# Altium footprint library KEY_PLC1.PcbLib: 123 footprints (part 1 of 8)
Each footprint in its own frame and in the unit in brackets; x right, y up, seen from the top. Pads: shape width x height; smd on the part's side, far side on the other; paste and mask are expansions set on the pad; w line width, h text height; cw(c..) or ccw(c..) is an arc to the next point about the centre after c.
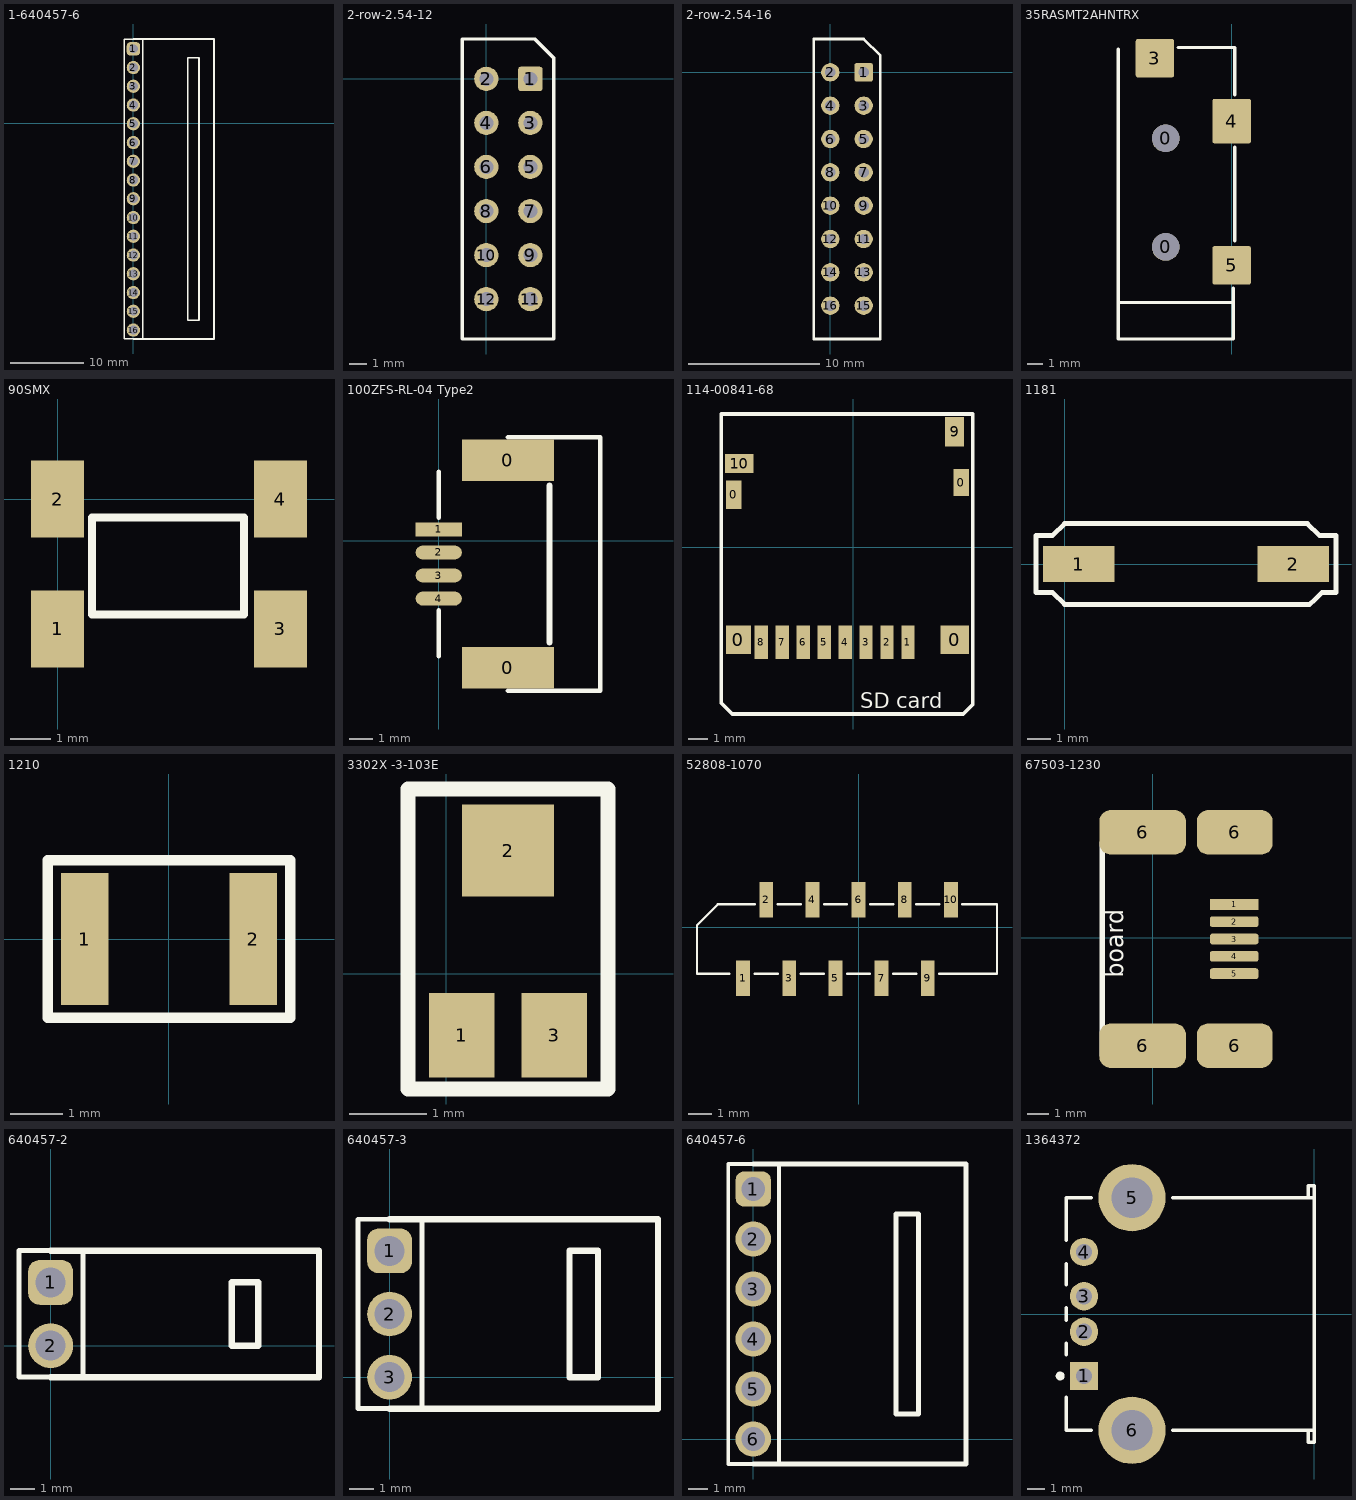
[diagram p0: the footprints below, top view; thin cyan lines are the x and y axes]

## 1-640457-6 [mm] "1-640457-6"
height 5.8
pads (16):
  rrect50% 1.8x1.8 hole 1.2: 1(0,10.1)
  round 1.8 hole 1.2: 2(0,7.56) 3(0,5.02) 4(0,2.48) 5(0,-0.06) 6(0,-2.6) 7(0,-5.14) 8(0,-7.68) 9(0,-10.22) 10(0,-12.76) 11(0,-15.3) 12(0,-17.84) 13(0,-20.38) 14(0,-22.92) 15(0,-25.46) 16(0,-28)
Top Overlay:
  lines w0.2: -1.27,-29.2 1.3,-29.2 1.3,11.43 -1.27,11.43 -1.27,-29.2
  lines w0.254: 0,-29.21 10.922,-29.21 10.922,11.43 0,11.43 ; 7.366,-26.67 7.366,8.89 8.89,8.89 8.89,-26.67 7.366,-26.67
3D body "c-0640457-16-s-3d.stp": height 5.87, standoff -3.52, extent -0.254,-29.21 10.795,11.43

## 2-row-2.54-12 [mm] "2-row-2.54-12"
pads (12):
  rrect20% 1.4x1.4 hole 0.8: 1(2.54,0)
  round 1.4 hole 0.8: 2(0,0) 3(2.54,-2.54) 4(0,-2.54) 5(2.54,-5.08) 6(0,-5.08) 7(2.54,-7.62) 8(0,-7.62) 9(2.54,-10.16) 10(0,-10.16) 11(2.54,-12.7) 12(0,-12.7)
Top Overlay:
  lines w0.2: -1.4,-15 -1.4,-12.8 -1.4,2.3 0.67,2.3 2.8,2.3 3.9,1.2 3.9,-15 -1.4,-15

## 2-row-2.54-16 [mm] "2-row-2.54-16"
pads (16):
  rrect20% 1.4x1.4 hole 0.8: 1(2.54,0)
  round 1.4 hole 0.8: 2(0,0) 3(2.54,-2.54) 4(0,-2.54) 5(2.54,-5.08) 6(0,-5.08) 7(2.54,-7.62) 8(0,-7.62) 9(2.54,-10.16) 10(0,-10.16) 11(2.54,-12.7) 12(0,-12.7) 13(2.54,-15.24) 14(0,-15.24) 15(2.54,-17.78) 16(0,-17.78)
Top Overlay:
  lines w0.2: -1.27,-20.32 3.81,-20.32 3.81,1.27 2.54,2.54 0.91,2.54 -1.27,2.54 -1.27,-12.67 -1.27,-20.32

## 35RASMT2AHNTRX [mm] "3.5 mm 35RASMT2AHNTRX"
height 4
pads (5):
  round 1.8 hole 1.8 unplated: 0(-4.3,8.8) 0(-4.3,15.875)
  rrect10% 2.5x2.5 smd: 3(-5,21.1) 5(0,7.6)
  rrect10% 2.5x2.9 smd: 4(0,17)
Top Overlay:
  lines w0.22: -7.4,21.7 -7.4,2.8 0.1,2.8 0.1,6.1 ; -7.35,5.175 0.05,5.175 ; -3.5,21.8 0.2,21.8 0.2,18.7 ; 0.2,9.2 0.2,15.3
3D body "35RASMT2AHNTRX.STEP": height 5.1, standoff -0.89, extent -7.318,2.775 0.175,21.775

## 90SMX [mm]
pads (4):
  rect 1.3x1.9 smd: 1(0,-3.2) 2(0,0) 3(5.5,-3.2) 4(5.5,0)
Top Overlay:
  lines w0.2: 0.85,-2.85 0.85,-0.45 2,-0.45 4.6,-0.45 4.6,-2.85 0.85,-2.85
3D body "User Library-EA96.step": height 1.5, standoff 0, extent -0.775,-3.225 6.325,-0.125

## 100ZFS-RL-04 Type2 [mm]
pads (6):
  rect 4x1.8 smd: 0(3,-5.5) 0(3,3.5)
  rect 2x0.6 smd: 1(0,0.5)
  oval 2x0.6 smd: 2(0,-0.5) 3(0,-1.5) 4(0,-2.5)
Top Overlay:
  lines w0.2: 0,-5 0,-3 ; 0,1 0,3 ; 3,-6.5 7,-6.5 7,4.5 3,4.5
  lines w0.254: 4.8,-4.4 4.8,2.4
3D body "12608.stp": height 2.51, standoff -0.07, extent 0,-6.96 6.55,4.96

## 114-00841-68 [mm] "uSD holder Amphenol"
height 2
pads (14):
  rect 0.8x1.5 smd: 0(-6.275,2.75)
  rect 1.3x1.5 smd: 0(-6.025,-4.85)
  rect 1.5x1.5 smd: 0(5.325,-4.85)
  rect 0.8x1.4 smd: 0(5.675,3.4)
  rect 0.7x1.75 smd: 1(2.875,-4.975) 2(1.775,-4.975) 3(0.675,-4.975) 4(-0.425,-4.975) 5(-1.525,-4.975) 6(-2.625,-4.975) 7(-3.725,-4.975) 8(-4.825,-4.975)
  rect 1x1.55 smd: 9(5.325,6.075)
  rect 1.5x1 smd: 10(-5.975,4.4)
Top Overlay:
  lines w0.2: -6.925,-8.175 -6.925,7 6.275,7 6.275,-8.25 5.775,-8.75 -6.35,-8.75 -6.925,-8.175
  text "SD card" at 0.375,-8.45 h0.8
3D body "User Library-Micro SD Holder 114-00841-68.step": height 1.6, standoff 0, extent -6.25,-5.275 5.75,6.325

## 1181 [mm] "1181"
height 6
pads (2):
  rect 3x1.5 smd: 1(0.6,0) 2(9.6,0)
Top Overlay:
  lines w0.2: 10.5,-1.5 10.8,-1.2 11.4,-1.2 11.4,1.2 10.7,1.2 10.2,1.7 0,1.7 -0.5,1.2 -1.2,1.2 -1.2,-1.2 -0.5,-1.2 0,-1.7 10.3,-1.7 10.5,-1.5 ; 10.5,-1.5 10.5,-1.5
3D body "User Library-Tact switch 1181_2.step": height 2.56, standoff -0.04, extent 1.05,-1.8 9.05,1.8

## 1210 [mm]
pads (2):
  rect 0.9x2.5 smd: 1(-1.6,0) 2(1.6,0)
Top Overlay:
  lines w0.2: -2.3,-1.5 2.3,-1.5 2.3,1.5 0.2,1.5 -2.3,1.5 -2.3,-1.5

## 3302X -3-103E [mm] "RESISTOR VARIABLE"
height 2.5
pads (3):
  rect 0.85x1.1 smd: 1(0.2,-0.8) 3(1.4,-0.8)
  rect 1.2x1.2 smd: 2(0.8,1.6)
Top Overlay:
  lines w0.2: -0.5,-1.5 -0.5,2.4 2.1,2.4 2.1,-1.5 -0.5,-1.5
3D body "User Library-3302X-3-103.step": height 1.1, standoff 0, extent -0.3,-1.021 1.9,1.875

## 52808-1070 [mm] "52808-1070 Molex"
height 5
pads (10):
  rect 0.6x1.55 smd: 1(-5,-2.2) 2(-4,1.2) 3(-3,-2.2) 4(-2,1.2) 5(-1,-2.2) 6(0,1.2) 7(1,-2.2) 8(2,1.2) 9(3,-2.2) 10(4,1.2)
Top Overlay:
  lines w0.1: -5.6,-2 -7,-2 -7,0.1 -6.1,1 -4.5,1 ; -4.5,-2 -3.5,-2 ; -3.5,1 -2.5,1 ; -2.5,-2 -1.5,-2 ; -1.5,1 -0.5,1 ; -0.5,-2 0.5,-2 ; 0.5,1 1.5,1 ; 1.5,-2 2.5,-2 ; 2.5,1 3.5,1 ; 3.5,-2 6,-2 6,1 4.5,1
3D body "528081070.stp": height 5.09, standoff -0.01, extent -7,-2.75 6,1.75

## 67503-1230 [mm] "67503-1230 MOLEX mini USB-B SMD"
height 5
pads (9):
  rect 2.25x0.5 smd: 1(3.75,1.55)
  rrect50% 2.25x0.5 smd: 2(3.75,0.75) 3(3.75,-0.05) 4(3.75,-0.85) 5(3.75,-1.65)
  rrect50% 4x2.05 smd: 6(-0.475,-4.975) 6(-0.475,4.875)
  rrect50% 3.5x2.05 smd: 6(3.775,-4.975) 6(3.775,4.875)
Top Overlay:
  lines w0.254: -2.35,-5.425 -2.35,4.4
  text "board" at -1.375,-1.85 h0.8
3D body "675031230.stp": height 3.9, standoff -0.05, extent -4.7,-5 4.3,4.9

## 640457-2 [mm] "640457-2"
height 5.8
pads (2):
  rrect50% 1.8x1.8 hole 1.2: 1(0,2.54)
  round 1.8 hole 1.2: 2(0,0)
Top Overlay:
  lines w0.2: -1.27,-1.26 1.3,-1.26 1.3,3.81 -1.27,3.81 -1.27,-1.26
  lines w0.254: 0,-1.27 10.77,-1.27 10.77,3.81 0,3.81 ; 7.264,0 7.264,2.54 8.331,2.54 8.331,0 7.264,0
3D body "c-0640457-02-s-3d.stp": height 5.87, standoff -3.52, extent -0.33,-1.295 10.719,3.785

## 640457-3 [mm] "640457-3"
height 5.8
pads (3):
  rrect50% 1.8x1.8 hole 1.2: 1(0,5.08)
  round 1.8 hole 1.2: 2(0,2.54) 3(0,0)
Top Overlay:
  lines w0.2: 0,6.35 -1.27,6.35 -1.27,-1.26 1.3,-1.26 1.3,6.35
  lines w0.254: 0,-1.27 10.795,-1.27 10.795,6.35 0,6.35 ; 7.239,0 8.382,0 8.382,5.08 7.239,5.08 7.239,0
3D body "c-0640457-03-s-3d.stp": height 5.87, standoff -3.52, extent -0.381,-1.27 10.668,6.35

## 640457-6 [mm] "640457-6"
height 5.8
pads (6):
  rrect50% 1.8x1.8 hole 1.2: 1(0,12.7)
  round 1.8 hole 1.2: 2(0,10.16) 3(0,7.62) 4(0,5.08) 5(0,2.54) 6(0,0)
Top Overlay:
  lines w0.2: -1.27,-1.26 -1.27,13.97 1.3,13.97 1.3,-1.26 -1.27,-1.26
  lines w0.254: 0,-1.27 10.795,-1.27 10.795,13.97 0,13.97 ; 7.239,1.27 8.382,1.27 8.382,11.43 7.239,11.43 7.239,1.27
3D body "c-0640457-06-s-3d.stp": height 5.87, standoff -3.52, extent -0.254,-1.27 10.795,13.97

## 1364372 [mm] "Connector; USB1.1, Type A, Thru-Hole; 4 Position; Right Angle"
height 7.01
pads (6):
  rect 1.6x1.6 hole 0.92: 1(-12.99,-3.5)
  round 1.6 hole 0.92: 2(-12.99,-1) 3(-12.99,1) 4(-12.99,3.5)
  round 3.8 hole 2.3: 5(-10.28,6.57) 6(-10.28,-6.57)
Top Overlay:
  circle w0.25: c-14.34,-3.5 r0.125
  lines w0.2: -14,-4.7 -14,-6.565 -12.58,-6.565 ; -14,-2.3 -14,-1.66 ; -14,-0.34 -14,0.34 ; -14,1.66 -14,2.84 ; -14,4.16 -14,6.565 -12.58,6.565 ; -7.98,-6.565 0,-6.565 ; -7.98,6.565 0,6.565 ; -0.32,-6.565 -0.32,-7.25 0,-7.25 0,-6.565 ; -0.32,6.565 -0.32,7.25 0,7.25 0,6.565 ; 0,-6.565 0,6.565
3D body "c-1364372-02-d-3d.stp": height 7.62, standoff -3.23, extent -13.975,-7.315 0.025,7.315